# Altium footprint library 7-Connectors-11.PcbLib: 59 footprints (part 3 of 4)
Each footprint in its own frame and in the unit in brackets; x right, y up, seen from the top. Pads: shape width x height; smd on the part's side, far side on the other; paste and mask are expansions set on the pad; w line width, h text height; cw(c..) or ccw(c..) is an arc to the next point about the centre after c.
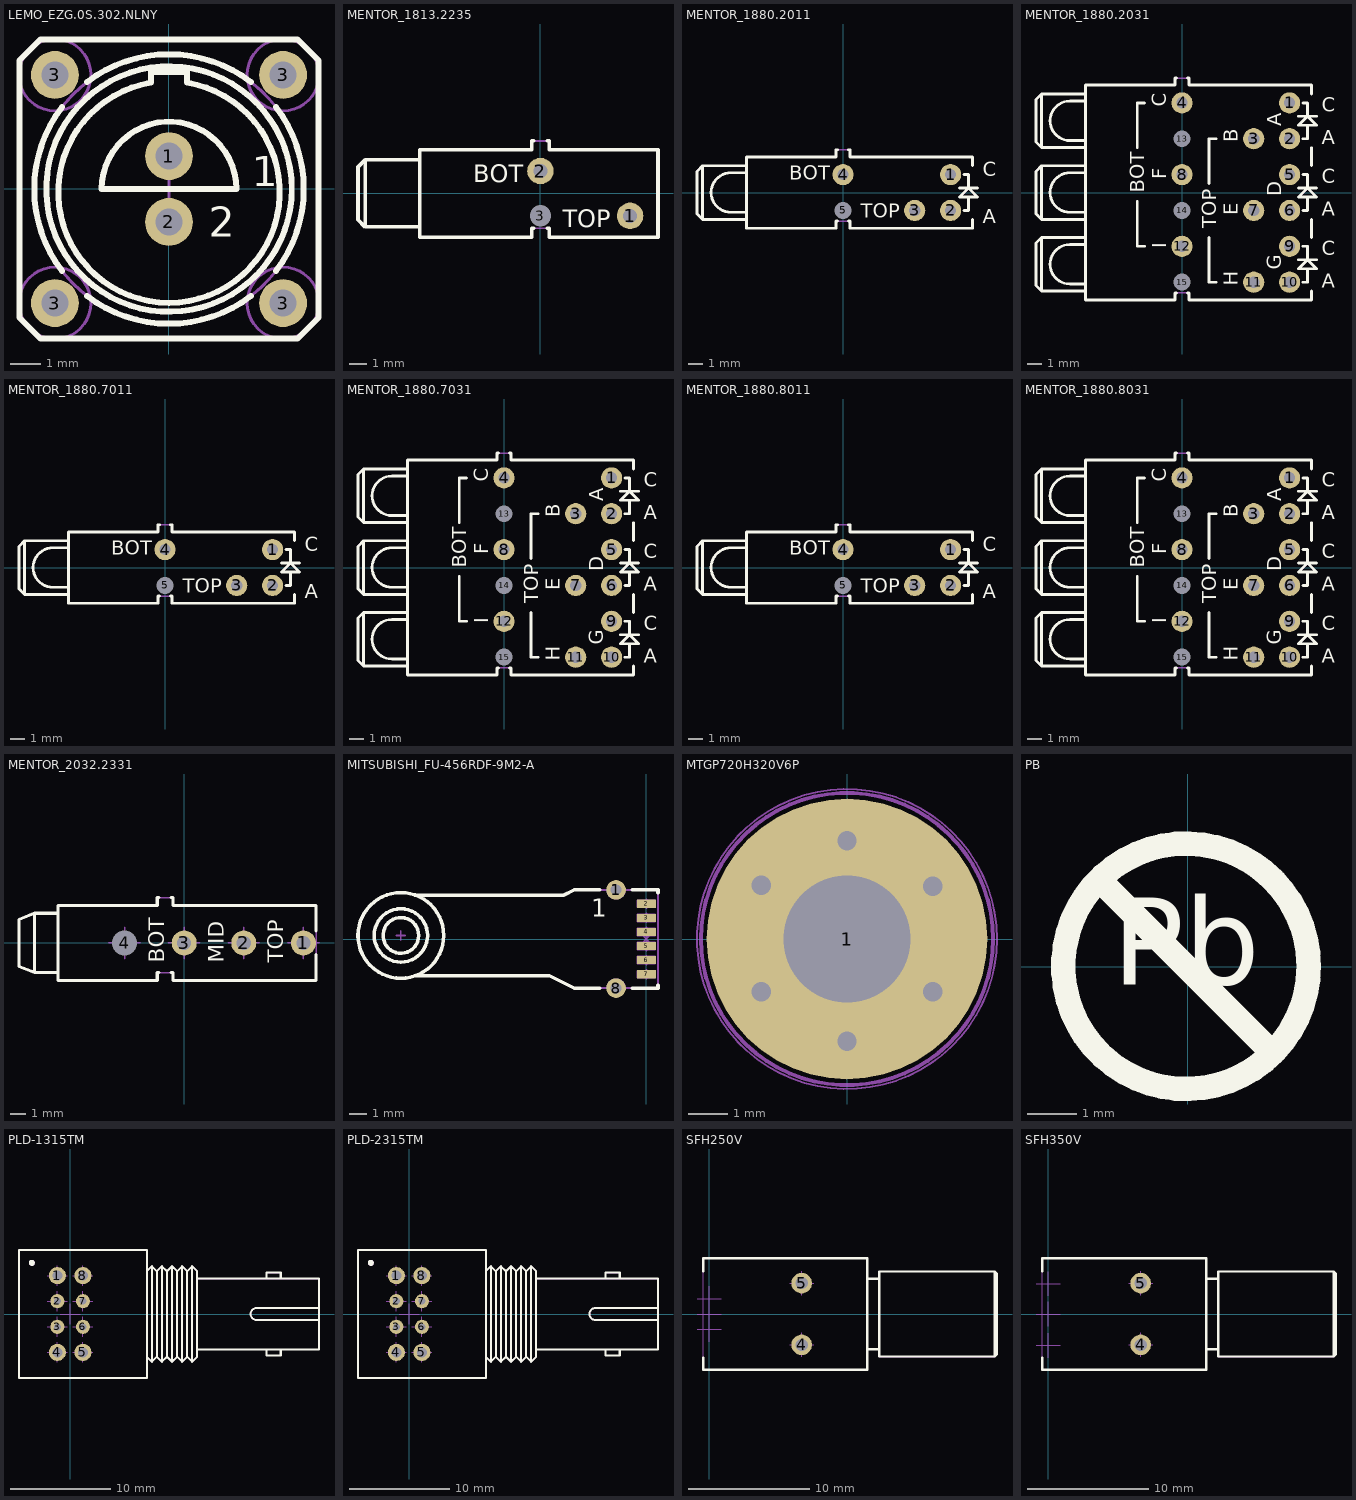
[diagram p2: the footprints below, top view; thin cyan lines are the x and y axes]

## LEMO_EZG.0S.302.NLNY [mm] "Serie 0S, 1 Female + 1 Male Contacts, Straight Socket With Key (G)"
height 15.8
pads (6):
  round 1.6 hole 0.9: 1(0,1.1) 2(0,-1.1) 3(-3.81,-3.81) 3(-3.81,3.81) 3(3.81,-3.81) 3(3.81,3.81)
Top Overlay:
  circle w0.2: c0,0 r4.1
  lines w0.2: -3.573,-2.736 cw(c0,0) -3.573,2.736 ; -2.736,-3.573 ccw(c0,0) 2.736,-3.573 ; -2.736,3.573 cw(c0,0) 2.736,3.573 ; 3.573,-2.736 ccw(c0,0) 3.573,2.736 ; -5,-4.293 -4.293,-5 4.293,-5 5,-4.293 5,4.293 4.293,5 -4.293,5 -5,4.293 -5,-4.293 ; -2.25,0 cw(c0,0) 2.25,0 -2.25,0 ; -0.6,3.551 ccw(c0,-0.1) 0.6,3.551 0.6,3.9 -0.6,3.9 -0.6,3.551
  text "1" at 2.764,0.091 h1
  text "2" at 1.326,-1.598 h1
Mechanical 8:
  circle w0.1: c-3.81,3.81 r1.2
  circle w0.1: c3.81,3.81 r1.2
  circle w0.1: c3.81,-3.81 r1.2
  circle w0.1: c-3.81,-3.81 r1.2
  lines w0.1: -4.31,-3.81 -3.81,-3.81 ; -4.31,3.81 -3.81,3.81 ; -3.81,-4.31 -3.81,-3.81 ; -3.81,-3.31 -3.81,-3.81 ; -3.81,3.31 -3.81,3.81 ; -3.81,4.31 -3.81,3.81 ; -3.31,-3.81 -3.81,-3.81 ; -3.31,3.81 -3.81,3.81 ; -0.5,-1.1 0,-1.1 ; -0.5,0 0,0 ; -0.5,1.1 0,1.1 ; 0,-1.6 0,-1.1 ; 0,-0.6 0,-1.1 ; 0,-0.5 0,0 ; 0,0.5 0,0 ; 0,0.6 0,1.1 ; 0,1.6 0,1.1 ; 0.5,-1.1 0,-1.1 ; 0.5,0 0,0 ; 0.5,1.1 0,1.1 ; 3.31,-3.81 3.81,-3.81 ; 3.31,3.81 3.81,3.81 ; 3.81,-4.31 3.81,-3.81 ; 3.81,-3.31 3.81,-3.81 ; 3.81,3.31 3.81,3.81 ; 3.81,4.31 3.81,3.81 ; 4.31,-3.81 3.81,-3.81 ; 4.31,3.81 3.81,3.81
Mechanical 14:
  circle w0.1: c0,0 r4.5
  circle w0.1: c0,0 r4.1
  circle w0.1: c0,1.1 r0.55
  circle w0.1: c0,-1.1 r0.5
  lines w0.1: -0.5,-1.1 0.5,-1.1 ; -0.49,-1.2 0.49,-1.2 ; -0.49,-1 0.49,-1 ; -0.458,-1.3 0.458,-1.3 ; -0.458,-0.9 0.458,-0.9 ; -0.4,-1.4 0.4,-1.4 ; -0.4,-0.8 0.4,-0.8 ; -0.3,-1.5 0.3,-1.5 ; -0.3,-0.7 0.3,-0.7 ; -5,-4.293 -4.293,-5 4.293,-5 5,-4.293 5,4.293 4.293,5 -4.293,5 -5,4.293 -5,-4.293 ; -2.25,0 cw(c0,0) 2.25,0 -2.25,0 ; -0.6,3.551 ccw(c0,-0.1) 0.6,3.551 0.6,3.9 -0.6,3.9 -0.6,3.551
  text "1" at 2.764,0.091 h1
  text "2" at 1.326,-1.598 h1
3D body "LEMO_EZG.0S.302.NLNY.stp": height 15.8, standoff -4, extent -5.01,-5.004 5.004,5.002

## MENTOR_1813.2235 [mm] "2 x Right Angled Test Jack 2mm"
height 9.95
pads (3):
  round 1.5 hole 0.8: 1(5.08,-1.27) 2(0,1.27)
  round 1 hole 1.2 unplated mask+0.2: 3(0,-1.27)
Top Overlay:
  lines w0.2: -6.84,-1.9 -9.94,-1.9 ; -6.84,1.9 -9.94,1.9 ; -0.39,-1.975 -0.5,-1.975 -0.5,-2.475 -6.84,-2.475 -6.84,2.475 -0.5,2.475 -0.5,2.975 -0.39,2.975 ; 0.39,-1.975 0.5,-1.975 0.5,-2.475 6.66,-2.475 6.66,2.475 0.5,2.475 0.5,2.975 0.39,2.975 ; -9.94,-1.9 -9.94,1.9 ; -9.94,-1.9 -10.34,-1.5 -10.34,1.5 -9.94,1.9
  text "BOT" at -3.81,0.635 h1
  text "TOP" at 1.27,-1.905 h1
Mechanical 14:
  lines w0.1: -6.84,-1.9 -9.94,-1.9 ; -6.84,1.9 -9.94,1.9 ; -9.94,-1.9 -9.94,1.9 ; -9.94,-1.9 -10.34,-1.5 -10.34,1.5 -9.94,1.9 ; -0.5,2.975 0.5,2.975 ; -0.5,2.975 -0.5,2.475 -6.84,2.475 -6.84,-2.475 -0.5,-2.475 -0.5,-1.975 0.5,-1.975 0.5,-2.475 6.66,-2.475 6.66,2.475 0.5,2.475 0.5,2.975 ; -0.5,2.975 0.5,2.975
3D body "MENTOR_1813.2235.stp": height 9.95, standoff -3.2, extent -10.3,-2.4 6.7,3.05

## MENTOR_1880.2011 [mm] "2 x Test Jack 2mm + 1 x Red LED 3mm PCB Edge Mounting"
height 15
pads (5):
  round 1.5 hole 0.8: 1(7.62,1.27) 2(7.62,-1.27) 3(5.08,-1.27) 4(0,1.27)
  round 1 hole 1.2 unplated mask+0.2: 5(0,-1.27)
Top Overlay:
  lines w0.2: -6.84,-1.9 -9.94,-1.9 ; -6.84,-1.4 -7.94,-1.4 cw(c-7.94,0) -7.94,1.4 -6.84,1.4 ; -6.84,1.9 -9.94,1.9 ; -0.39,-2.025 -0.5,-2.025 -0.5,-2.525 -6.84,-2.525 -6.84,2.525 -0.5,2.525 -0.5,3.025 -0.39,3.025 ; 0.39,-2.025 0.5,-2.025 0.5,-2.525 9.16,-2.525 9.16,-1.905 ; 0.39,3.025 0.5,3.025 0.5,2.525 9.16,2.525 9.16,1.905 ; 8.255,0.318 9.525,0.318 ; 8.573,-1.27 8.89,-1.27 ; 8.573,1.27 8.89,1.27 8.89,0.318 ; 8.62,-1.27 8.89,-1.27 ; 8.89,-0.318 8.89,-1.27 ; -9.94,-1.9 -10.34,-1.5 -10.34,1.5 -9.94,1.9 ; -9.94,-1.9 -9.94,1.9 ; 8.89,0.318 9.525,-0.318 8.255,-0.318 8.89,0.318
  text "BOT" at -3.81,0.889 h1
  text "TOP" at 1.27,-1.778 h1
  text "A" at 9.906,-2.159 h1
  text "C" at 9.906,1.143 h1
Mechanical 14:
  lines w0.1: -6.84,-1.9 -9.94,-1.9 ; -6.84,1.9 -9.94,1.9 ; 8.255,0.318 9.525,0.318 ; 8.573,-1.27 8.89,-1.27 ; 8.573,1.27 8.89,1.27 8.89,0.318 ; 8.62,-1.27 8.89,-1.27 ; 8.89,-0.318 8.89,-1.27 ; 9.16,-1.905 9.16,-2.525 0.5,-2.525 0.5,-2.025 -0.5,-2.025 -0.5,-2.525 -6.84,-2.525 -6.84,2.525 -0.5,2.525 -0.5,3.025 0.5,3.025 0.5,2.525 9.16,2.525 9.16,1.905 ; -9.94,-1.9 -10.34,-1.5 -10.34,1.5 -9.94,1.9 ; -9.94,-1.9 -9.94,1.9 ; -7.94,-1.4 cw(c-7.94,0) -7.94,1.4 ; -7.94,-1.4 -6.84,-1.4 -7.94,-1.4 ; -7.94,1.4 -6.84,1.4 -7.94,1.4 ; 8.89,0.318 9.525,-0.318 8.255,-0.318 8.89,0.318
  text "A" at 9.906,-2.159 h1
  text "TOP" at 1.27,-1.778 h1
  text "BOT" at -3.81,0.889 h1
  text "C" at 9.906,1.143 h1
3D body "MENTOR_1880.2011.stp": height 15, standoff -3.2, extent -10.3,-2.575 9.2,2.975

## MENTOR_1880.2031 [mm] "6 x Test Jack 2mm + 3 x Red LED 3mm PCB Edge Mounting"
height 15
pads (15):
  round 1.5 hole 0.8: 1(7.62,6.35) 2(7.62,3.81) 3(5.08,3.81) 4(0,6.35) 5(7.62,1.27) 6(7.62,-1.27) 7(5.08,-1.27) 8(0,1.27) 9(7.62,-3.81) 10(7.62,-6.35) 11(5.08,-6.35) 12(0,-3.81)
  round 1 hole 1.2 unplated mask+0.2: 13(0,3.81) 14(0,-1.27) 15(0,-6.35)
Top Overlay:
  lines w0.2: -6.84,-6.98 -9.94,-6.98 ; -6.84,-6.48 -7.94,-6.48 cw(c-7.94,-5.08) -7.94,-3.68 -6.84,-3.68 ; -6.84,-3.18 -9.94,-3.18 ; -6.84,-1.9 -9.94,-1.9 ; -6.84,-1.4 -7.94,-1.4 cw(c-7.94,0) -7.94,1.4 -6.84,1.4 ; -6.84,1.9 -9.94,1.9 ; -6.84,3.18 -9.94,3.18 ; -6.84,3.68 -7.94,3.68 cw(c-7.94,5.08) -7.94,6.48 -6.84,6.48 ; -6.84,6.98 -9.94,6.98 ; -3.175,-0.635 -3.175,-3.81 -2.667,-3.81 ; -3.175,3.175 -3.175,6.35 -2.667,6.35 ; -0.39,-7.105 -0.5,-7.105 -0.5,-7.605 -6.84,-7.605 -6.84,7.605 -0.5,7.605 -0.5,8.105 -0.39,8.105 ; 0.39,-7.105 0.5,-7.105 0.5,-7.605 9.16,-7.605 9.16,-6.985 ; 0.39,8.105 0.5,8.105 0.5,7.605 9.16,7.605 9.16,6.985 ; 1.905,-3.175 1.905,-6.35 2.413,-6.35 ; 1.905,0.635 1.905,3.81 2.413,3.81 ; 8.255,-4.762 9.525,-4.762 ; 8.255,0.318 9.525,0.318 ; 8.255,5.398 9.525,5.398 ; 8.573,-6.35 8.89,-6.35 ; 8.573,-3.81 8.89,-3.81 8.89,-4.762 ; 8.573,-1.27 8.89,-1.27 ; 8.573,1.27 8.89,1.27 8.89,0.318 ; 8.573,3.81 8.89,3.81 ; 8.573,6.35 8.89,6.35 8.89,5.398 ; 8.62,-6.35 8.89,-6.35 ; 8.62,-1.27 8.89,-1.27 ; 8.62,3.81 8.89,3.81 ; 8.89,-5.398 8.89,-6.35 ; 8.89,-0.318 8.89,-1.27 ; 8.89,4.762 8.89,3.81 ; 9.16,-3.175 9.16,-1.905 ; 9.16,1.905 9.16,3.175 ; -9.94,-6.98 -10.34,-6.58 -10.34,-3.58 -9.94,-3.18 ; -9.94,-6.98 -9.94,-3.18 ; -9.94,-1.9 -9.94,1.9 ; -9.94,-1.9 -10.34,-1.5 -10.34,1.5 -9.94,1.9 ; -9.94,3.18 -10.34,3.58 -10.34,6.58 -9.94,6.98 ; -9.94,3.18 -9.94,6.98 ; 8.89,-4.762 9.525,-5.398 8.255,-5.398 8.89,-4.762 ; 8.89,0.318 8.255,-0.318 9.525,-0.318 8.89,0.318 ; 8.89,5.398 9.525,4.762 8.255,4.762 8.89,5.398
  text "BOT" at -2.667,0 h1
  text "C" at -1.116,6.091 h1
  text "I" at -1.116,-3.942 h1
  text "F" at -1.116,0.932 h1
  text "C" at 9.906,0.643 h1
  text "A" at 9.906,-1.659 h1
  text "E" at 3.964,-1.608 h1
  text "H" at 3.964,-6.609 h1
  text "A" at 9.906,-6.739 h1
  text "C" at 9.906,-4.437 h1
  text "B" at 3.964,3.551 h1
  text "A" at 9.906,3.421 h1
  text "C" at 9.906,5.723 h1
  text "A" at 7.012,4.695 h1
  text "D" at 7.012,-0.258 h1
  text "G" at 7.012,-5.465 h1
  text "TOP" at 2.413,-2.54 h1
Mechanical 14:
  lines w0.1: -6.84,-6.98 -9.94,-6.98 ; -6.84,-3.18 -9.94,-3.18 ; -6.84,-1.9 -9.94,-1.9 ; -6.84,1.9 -9.94,1.9 ; -6.84,3.18 -9.94,3.18 ; -6.84,6.98 -9.94,6.98 ; -3.175,-0.635 -3.175,-3.81 -2.667,-3.81 ; -3.175,3.175 -3.175,6.35 -2.667,6.35 ; 1.905,-3.175 1.905,-6.35 2.413,-6.35 ; 1.905,0.635 1.905,3.81 2.413,3.81 ; 8.255,-4.762 9.525,-4.762 ; 8.255,0.318 9.525,0.318 ; 8.255,5.398 9.525,5.398 ; 8.573,-6.35 8.89,-6.35 ; 8.573,-3.81 8.89,-3.81 8.89,-4.762 ; 8.573,-1.27 8.89,-1.27 ; 8.573,1.27 8.89,1.27 8.89,0.318 ; 8.573,3.81 8.89,3.81 ; 8.573,6.35 8.89,6.35 8.89,5.398 ; 8.62,-6.35 8.89,-6.35 ; 8.62,-1.27 8.89,-1.27 ; 8.62,3.81 8.89,3.81 ; 8.89,-5.398 8.89,-6.35 ; 8.89,-0.318 8.89,-1.27 ; 8.89,4.762 8.89,3.81 ; 9.16,-6.985 9.16,-7.605 0.5,-7.605 0.5,-7.105 -0.5,-7.105 -0.5,-7.605 -6.84,-7.605 -6.84,7.605 -0.5,7.605 -0.5,8.105 0.5,8.105 0.5,7.605 9.16,7.605 9.16,6.985 ; 9.16,-3.175 9.16,-1.905 ; 9.16,1.905 9.16,3.175 ; -9.94,-6.98 -10.34,-6.58 -10.34,-3.58 -9.94,-3.18 ; -9.94,-6.98 -9.94,-3.18 ; -9.94,-1.9 -9.94,1.9 ; -9.94,-1.9 -10.34,-1.5 -10.34,1.5 -9.94,1.9 ; -9.94,3.18 -10.34,3.58 -10.34,6.58 -9.94,6.98 ; -9.94,3.18 -9.94,6.98 ; -7.94,-6.48 cw(c-7.94,-5.08) -7.94,-3.68 ; -7.94,-6.48 -6.84,-6.48 -7.94,-6.48 ; -7.94,-3.68 -6.84,-3.68 -7.94,-3.68 ; -7.94,-1.4 cw(c-7.94,0) -7.94,1.4 ; -7.94,-1.4 -6.84,-1.4 -7.94,-1.4 ; -7.94,1.4 -6.84,1.4 -7.94,1.4 ; -7.94,3.68 cw(c-7.94,5.08) -7.94,6.48 ; -7.94,3.68 -6.84,3.68 -7.94,3.68 ; -7.94,6.48 -6.84,6.48 -7.94,6.48 ; 8.89,-4.762 9.525,-5.398 8.255,-5.398 8.89,-4.762 ; 8.89,0.318 8.255,-0.318 9.525,-0.318 8.89,0.318 ; 8.89,5.398 9.525,4.762 8.255,4.762 8.89,5.398
  text "BOT" at -2.667,0 h1
  text "C" at -1.116,6.091 h1
  text "I" at -1.116,-3.942 h1
  text "F" at -1.116,0.932 h1
  text "E" at 3.964,-1.608 h1
  text "A" at 9.906,-1.659 h1
  text "C" at 9.906,0.643 h1
  text "C" at 9.906,-4.437 h1
  text "A" at 9.906,-6.739 h1
  text "H" at 3.964,-6.609 h1
  text "C" at 9.906,5.723 h1
  text "A" at 9.906,3.421 h1
  text "B" at 3.964,3.551 h1
  text "A" at 7.012,4.695 h1
  text "D" at 7.012,-0.258 h1
  text "G" at 7.012,-5.465 h1
  text "TOP" at 2.413,-2.54 h1
3D body "MENTOR_1880.2031.stp": height 15, standoff -3.1, extent -10.34,-7.6 9.16,8.1

## MENTOR_1880.7011 [mm] "2 x Test Jack 2mm + 1 x Yellow LED 3mm PCB Edge Mounting"
height 15
pads (5):
  round 1.5 hole 0.8: 1(7.62,1.27) 2(7.62,-1.27) 3(5.08,-1.27) 4(0,1.27)
  round 1 hole 1.2 unplated mask+0.2: 5(0,-1.27)
Top Overlay:
  lines w0.2: -6.84,-1.9 -9.94,-1.9 ; -6.84,-1.4 -7.94,-1.4 cw(c-7.94,0) -7.94,1.4 -6.84,1.4 ; -6.84,1.9 -9.94,1.9 ; -0.39,-2.025 -0.5,-2.025 -0.5,-2.525 -6.84,-2.525 -6.84,2.525 -0.5,2.525 -0.5,3.025 -0.39,3.025 ; 0.39,-2.025 0.5,-2.025 0.5,-2.525 9.16,-2.525 9.16,-1.905 ; 0.39,3.025 0.5,3.025 0.5,2.525 9.16,2.525 9.16,1.905 ; 8.255,0.318 9.525,0.318 ; 8.573,-1.27 8.89,-1.27 ; 8.573,1.27 8.89,1.27 8.89,0.318 ; 8.62,-1.27 8.89,-1.27 ; 8.89,-0.318 8.89,-1.27 ; -9.94,-1.9 -10.34,-1.5 -10.34,1.5 -9.94,1.9 ; -9.94,-1.9 -9.94,1.9 ; 8.89,0.318 9.525,-0.318 8.255,-0.318 8.89,0.318
  text "BOT" at -3.81,0.889 h1
  text "TOP" at 1.27,-1.778 h1
  text "A" at 9.906,-2.159 h1
  text "C" at 9.906,1.143 h1
Mechanical 14:
  lines w0.1: -6.84,-1.9 -9.94,-1.9 ; -6.84,1.9 -9.94,1.9 ; 8.255,0.318 9.525,0.318 ; 8.573,-1.27 8.89,-1.27 ; 8.573,1.27 8.89,1.27 8.89,0.318 ; 8.62,-1.27 8.89,-1.27 ; 8.89,-0.318 8.89,-1.27 ; 9.16,-1.905 9.16,-2.525 0.5,-2.525 0.5,-2.025 -0.5,-2.025 -0.5,-2.525 -6.84,-2.525 -6.84,2.525 -0.5,2.525 -0.5,3.025 0.5,3.025 0.5,2.525 9.16,2.525 9.16,1.905 ; -9.94,-1.9 -10.34,-1.5 -10.34,1.5 -9.94,1.9 ; -9.94,-1.9 -9.94,1.9 ; -7.94,-1.4 cw(c-7.94,0) -7.94,1.4 ; -7.94,-1.4 -6.84,-1.4 -7.94,-1.4 ; -7.94,1.4 -6.84,1.4 -7.94,1.4 ; 8.89,0.318 9.525,-0.318 8.255,-0.318 8.89,0.318
  text "A" at 9.906,-2.159 h1
  text "TOP" at 1.27,-1.778 h1
  text "BOT" at -3.81,0.889 h1
  text "C" at 9.906,1.143 h1
3D body "MENTOR_1880.7011.stp": height 15, standoff -3.2, extent -10.3,-2.575 9.2,2.975

## MENTOR_1880.7031 [mm] "6 x Test Jack 2mm + 3 x Yellow LED 3mm PCB Edge Mounting"
height 15
pads (15):
  round 1.5 hole 0.8: 1(7.62,6.35) 2(7.62,3.81) 3(5.08,3.81) 4(0,6.35) 5(7.62,1.27) 6(7.62,-1.27) 7(5.08,-1.27) 8(0,1.27) 9(7.62,-3.81) 10(7.62,-6.35) 11(5.08,-6.35) 12(0,-3.81)
  round 1 hole 1.2 unplated mask+0.2: 13(0,3.81) 14(0,-1.27) 15(0,-6.35)
Top Overlay:
  lines w0.2: -6.84,-6.98 -9.94,-6.98 ; -6.84,-6.48 -7.94,-6.48 cw(c-7.94,-5.08) -7.94,-3.68 -6.84,-3.68 ; -6.84,-3.18 -9.94,-3.18 ; -6.84,-1.9 -9.94,-1.9 ; -6.84,-1.4 -7.94,-1.4 cw(c-7.94,0) -7.94,1.4 -6.84,1.4 ; -6.84,1.9 -9.94,1.9 ; -6.84,3.18 -9.94,3.18 ; -6.84,3.68 -7.94,3.68 cw(c-7.94,5.08) -7.94,6.48 -6.84,6.48 ; -6.84,6.98 -9.94,6.98 ; -3.175,-0.635 -3.175,-3.81 -2.667,-3.81 ; -3.175,3.175 -3.175,6.35 -2.667,6.35 ; -0.39,-7.105 -0.5,-7.105 -0.5,-7.605 -6.84,-7.605 -6.84,7.605 -0.5,7.605 -0.5,8.105 -0.39,8.105 ; 0.39,-7.105 0.5,-7.105 0.5,-7.605 9.16,-7.605 9.16,-6.985 ; 0.39,8.105 0.5,8.105 0.5,7.605 9.16,7.605 9.16,6.985 ; 1.905,-3.175 1.905,-6.35 2.413,-6.35 ; 1.905,0.635 1.905,3.81 2.413,3.81 ; 8.255,-4.762 9.525,-4.762 ; 8.255,0.318 9.525,0.318 ; 8.255,5.398 9.525,5.398 ; 8.573,-6.35 8.89,-6.35 ; 8.573,-3.81 8.89,-3.81 8.89,-4.762 ; 8.573,-1.27 8.89,-1.27 ; 8.573,1.27 8.89,1.27 8.89,0.318 ; 8.573,3.81 8.89,3.81 ; 8.573,6.35 8.89,6.35 8.89,5.398 ; 8.62,-6.35 8.89,-6.35 ; 8.62,-1.27 8.89,-1.27 ; 8.62,3.81 8.89,3.81 ; 8.89,-5.398 8.89,-6.35 ; 8.89,-0.318 8.89,-1.27 ; 8.89,4.762 8.89,3.81 ; 9.16,-3.175 9.16,-1.905 ; 9.16,1.905 9.16,3.175 ; -9.94,-6.98 -10.34,-6.58 -10.34,-3.58 -9.94,-3.18 ; -9.94,-6.98 -9.94,-3.18 ; -9.94,-1.9 -9.94,1.9 ; -9.94,-1.9 -10.34,-1.5 -10.34,1.5 -9.94,1.9 ; -9.94,3.18 -10.34,3.58 -10.34,6.58 -9.94,6.98 ; -9.94,3.18 -9.94,6.98 ; 8.89,-4.762 9.525,-5.398 8.255,-5.398 8.89,-4.762 ; 8.89,0.318 8.255,-0.318 9.525,-0.318 8.89,0.318 ; 8.89,5.398 9.525,4.762 8.255,4.762 8.89,5.398
  text "BOT" at -2.667,0 h1
  text "C" at -1.116,6.091 h1
  text "I" at -1.116,-3.942 h1
  text "F" at -1.116,0.932 h1
  text "C" at 9.906,0.643 h1
  text "A" at 9.906,-1.659 h1
  text "E" at 3.964,-1.608 h1
  text "H" at 3.964,-6.609 h1
  text "A" at 9.906,-6.739 h1
  text "C" at 9.906,-4.437 h1
  text "B" at 3.964,3.551 h1
  text "A" at 9.906,3.421 h1
  text "C" at 9.906,5.723 h1
  text "A" at 7.012,4.695 h1
  text "D" at 7.012,-0.258 h1
  text "G" at 7.012,-5.465 h1
  text "TOP" at 2.413,-2.54 h1
Mechanical 14:
  lines w0.1: -6.84,-6.98 -9.94,-6.98 ; -6.84,-3.18 -9.94,-3.18 ; -6.84,-1.9 -9.94,-1.9 ; -6.84,1.9 -9.94,1.9 ; -6.84,3.18 -9.94,3.18 ; -6.84,6.98 -9.94,6.98 ; -3.175,-0.635 -3.175,-3.81 -2.667,-3.81 ; -3.175,3.175 -3.175,6.35 -2.667,6.35 ; 1.905,-3.175 1.905,-6.35 2.413,-6.35 ; 1.905,0.635 1.905,3.81 2.413,3.81 ; 8.255,-4.762 9.525,-4.762 ; 8.255,0.318 9.525,0.318 ; 8.255,5.398 9.525,5.398 ; 8.573,-6.35 8.89,-6.35 ; 8.573,-3.81 8.89,-3.81 8.89,-4.762 ; 8.573,-1.27 8.89,-1.27 ; 8.573,1.27 8.89,1.27 8.89,0.318 ; 8.573,3.81 8.89,3.81 ; 8.573,6.35 8.89,6.35 8.89,5.398 ; 8.62,-6.35 8.89,-6.35 ; 8.62,-1.27 8.89,-1.27 ; 8.62,3.81 8.89,3.81 ; 8.89,-5.398 8.89,-6.35 ; 8.89,-0.318 8.89,-1.27 ; 8.89,4.762 8.89,3.81 ; 9.16,-6.985 9.16,-7.605 0.5,-7.605 0.5,-7.105 -0.5,-7.105 -0.5,-7.605 -6.84,-7.605 -6.84,7.605 -0.5,7.605 -0.5,8.105 0.5,8.105 0.5,7.605 9.16,7.605 9.16,6.985 ; 9.16,-3.175 9.16,-1.905 ; 9.16,1.905 9.16,3.175 ; -9.94,-6.98 -10.34,-6.58 -10.34,-3.58 -9.94,-3.18 ; -9.94,-6.98 -9.94,-3.18 ; -9.94,-1.9 -9.94,1.9 ; -9.94,-1.9 -10.34,-1.5 -10.34,1.5 -9.94,1.9 ; -9.94,3.18 -10.34,3.58 -10.34,6.58 -9.94,6.98 ; -9.94,3.18 -9.94,6.98 ; -7.94,-6.48 cw(c-7.94,-5.08) -7.94,-3.68 ; -7.94,-6.48 -6.84,-6.48 -7.94,-6.48 ; -7.94,-3.68 -6.84,-3.68 -7.94,-3.68 ; -7.94,-1.4 cw(c-7.94,0) -7.94,1.4 ; -7.94,-1.4 -6.84,-1.4 -7.94,-1.4 ; -7.94,1.4 -6.84,1.4 -7.94,1.4 ; -7.94,3.68 cw(c-7.94,5.08) -7.94,6.48 ; -7.94,3.68 -6.84,3.68 -7.94,3.68 ; -7.94,6.48 -6.84,6.48 -7.94,6.48 ; 8.89,-4.762 9.525,-5.398 8.255,-5.398 8.89,-4.762 ; 8.89,0.318 8.255,-0.318 9.525,-0.318 8.89,0.318 ; 8.89,5.398 9.525,4.762 8.255,4.762 8.89,5.398
  text "BOT" at -2.667,0 h1
  text "C" at -1.116,6.091 h1
  text "I" at -1.116,-3.942 h1
  text "F" at -1.116,0.932 h1
  text "E" at 3.964,-1.608 h1
  text "A" at 9.906,-1.659 h1
  text "C" at 9.906,0.643 h1
  text "C" at 9.906,-4.437 h1
  text "A" at 9.906,-6.739 h1
  text "H" at 3.964,-6.609 h1
  text "C" at 9.906,5.723 h1
  text "A" at 9.906,3.421 h1
  text "B" at 3.964,3.551 h1
  text "A" at 7.012,4.695 h1
  text "D" at 7.012,-0.258 h1
  text "G" at 7.012,-5.465 h1
  text "TOP" at 2.413,-2.54 h1
3D body "MENTOR_1880.7031.stp": height 15, standoff -3.1, extent -10.34,-7.6 9.16,8.1

## MENTOR_1880.8011 [mm] "2 x Test Jack 2mm + 1 x Green LED 3mm PCB Edge Mounting"
height 15
pads (5):
  round 1.5 hole 0.8: 1(7.62,1.27) 2(7.62,-1.27) 3(5.08,-1.27) 4(0,1.27)
  round 1 hole 1.2 unplated mask+0.2: 5(0,-1.27)
Top Overlay:
  lines w0.2: -6.84,-1.9 -9.94,-1.9 ; -6.84,-1.4 -7.94,-1.4 cw(c-7.94,0) -7.94,1.4 -6.84,1.4 ; -6.84,1.9 -9.94,1.9 ; -0.39,-2.025 -0.5,-2.025 -0.5,-2.525 -6.84,-2.525 -6.84,2.525 -0.5,2.525 -0.5,3.025 -0.39,3.025 ; 0.39,-2.025 0.5,-2.025 0.5,-2.525 9.16,-2.525 9.16,-1.905 ; 0.39,3.025 0.5,3.025 0.5,2.525 9.16,2.525 9.16,1.905 ; 8.255,0.318 9.525,0.318 ; 8.573,-1.27 8.89,-1.27 ; 8.573,1.27 8.89,1.27 8.89,0.318 ; 8.62,-1.27 8.89,-1.27 ; 8.89,-0.318 8.89,-1.27 ; -9.94,-1.9 -9.94,1.9 ; -9.94,-1.9 -10.34,-1.5 -10.34,1.5 -9.94,1.9 ; 8.89,0.318 8.255,-0.318 9.525,-0.318 8.89,0.318
  text "C" at 9.906,1.143 h1
  text "A" at 9.906,-2.159 h1
  text "TOP" at 1.27,-1.778 h1
  text "BOT" at -3.81,0.889 h1
Mechanical 14:
  lines w0.1: -6.84,-1.9 -9.94,-1.9 ; -6.84,1.9 -9.94,1.9 ; 8.255,0.318 9.525,0.318 ; 8.573,-1.27 8.89,-1.27 ; 8.573,1.27 8.89,1.27 8.89,0.318 ; 8.62,-1.27 8.89,-1.27 ; 8.89,-0.318 8.89,-1.27 ; 9.16,-1.905 9.16,-2.525 0.5,-2.525 0.5,-2.025 -0.5,-2.025 -0.5,-2.525 -6.84,-2.525 -6.84,2.525 -0.5,2.525 -0.5,3.025 0.5,3.025 0.5,2.525 9.16,2.525 9.16,1.905 ; -9.94,-1.9 -9.94,1.9 ; -9.94,-1.9 -10.34,-1.5 -10.34,1.5 -9.94,1.9 ; -7.94,-1.4 cw(c-7.94,0) -7.94,1.4 ; -7.94,-1.4 -6.84,-1.4 -7.94,-1.4 ; -7.94,1.4 -6.84,1.4 -7.94,1.4 ; 8.89,0.318 8.255,-0.318 9.525,-0.318 8.89,0.318
  text "C" at 9.906,1.143 h1
  text "BOT" at -3.81,0.889 h1
  text "TOP" at 1.27,-1.778 h1
  text "A" at 9.906,-2.159 h1
3D body "MENTOR_1880.8011.stp": height 15, standoff -3.2, extent -10.3,-2.575 9.2,2.975

## MENTOR_1880.8031 [mm] "6 x Test Jack 2mm + 3 x Green LED 3mm PCB Edge Mounting"
height 15
pads (15):
  round 1.5 hole 0.8: 1(7.62,6.35) 2(7.62,3.81) 3(5.08,3.81) 4(0,6.35) 5(7.62,1.27) 6(7.62,-1.27) 7(5.08,-1.27) 8(0,1.27) 9(7.62,-3.81) 10(7.62,-6.35) 11(5.08,-6.35) 12(0,-3.81)
  round 1 hole 1.2 unplated mask+0.2: 13(0,3.81) 14(0,-1.27) 15(0,-6.35)
Top Overlay:
  lines w0.2: -6.84,-6.98 -9.94,-6.98 ; -6.84,-6.48 -7.94,-6.48 cw(c-7.94,-5.08) -7.94,-3.68 -6.84,-3.68 ; -6.84,-3.18 -9.94,-3.18 ; -6.84,-1.9 -9.94,-1.9 ; -6.84,-1.4 -7.94,-1.4 cw(c-7.94,0) -7.94,1.4 -6.84,1.4 ; -6.84,1.9 -9.94,1.9 ; -6.84,3.18 -9.94,3.18 ; -6.84,3.68 -7.94,3.68 cw(c-7.94,5.08) -7.94,6.48 -6.84,6.48 ; -6.84,6.98 -9.94,6.98 ; -3.175,-0.635 -3.175,-3.81 -2.667,-3.81 ; -3.175,3.175 -3.175,6.35 -2.667,6.35 ; -0.39,-7.105 -0.5,-7.105 -0.5,-7.605 -6.84,-7.605 -6.84,7.605 -0.5,7.605 -0.5,8.105 -0.39,8.105 ; 0.39,-7.105 0.5,-7.105 0.5,-7.605 9.16,-7.605 9.16,-6.985 ; 0.39,8.105 0.5,8.105 0.5,7.605 9.16,7.605 9.16,6.985 ; 1.905,-3.175 1.905,-6.35 2.413,-6.35 ; 1.905,0.635 1.905,3.81 2.413,3.81 ; 8.255,-4.762 9.525,-4.762 ; 8.255,0.318 9.525,0.318 ; 8.255,5.398 9.525,5.398 ; 8.573,-6.35 8.89,-6.35 ; 8.573,-3.81 8.89,-3.81 8.89,-4.762 ; 8.573,-1.27 8.89,-1.27 ; 8.573,1.27 8.89,1.27 8.89,0.318 ; 8.573,3.81 8.89,3.81 ; 8.573,6.35 8.89,6.35 8.89,5.398 ; 8.62,-6.35 8.89,-6.35 ; 8.62,-1.27 8.89,-1.27 ; 8.62,3.81 8.89,3.81 ; 8.89,-5.398 8.89,-6.35 ; 8.89,-0.318 8.89,-1.27 ; 8.89,4.762 8.89,3.81 ; 9.16,-3.175 9.16,-1.905 ; 9.16,1.905 9.16,3.175 ; -9.94,-6.98 -9.94,-3.18 ; -9.94,-6.98 -10.34,-6.58 -10.34,-3.58 -9.94,-3.18 ; -9.94,-1.9 -10.34,-1.5 -10.34,1.5 -9.94,1.9 ; -9.94,-1.9 -9.94,1.9 ; -9.94,3.18 -9.94,6.98 ; -9.94,3.18 -10.34,3.58 -10.34,6.58 -9.94,6.98 ; 8.89,-4.762 8.255,-5.398 9.525,-5.398 8.89,-4.762 ; 8.89,0.318 9.525,-0.318 8.255,-0.318 8.89,0.318 ; 8.89,5.398 8.255,4.762 9.525,4.762 8.89,5.398
  text "TOP" at 2.413,-2.54 h1
  text "G" at 7.012,-5.465 h1
  text "D" at 7.012,-0.258 h1
  text "A" at 7.012,4.695 h1
  text "C" at 9.906,5.723 h1
  text "A" at 9.906,3.421 h1
  text "B" at 3.964,3.551 h1
  text "C" at 9.906,-4.437 h1
  text "A" at 9.906,-6.739 h1
  text "H" at 3.964,-6.609 h1
  text "E" at 3.964,-1.608 h1
  text "A" at 9.906,-1.659 h1
  text "C" at 9.906,0.643 h1
  text "F" at -1.116,0.932 h1
  text "I" at -1.116,-3.942 h1
  text "C" at -1.116,6.091 h1
  text "BOT" at -2.667,0 h1
Mechanical 14:
  lines w0.1: -6.84,-6.98 -9.94,-6.98 ; -6.84,-3.18 -9.94,-3.18 ; -6.84,-1.9 -9.94,-1.9 ; -6.84,1.9 -9.94,1.9 ; -6.84,3.18 -9.94,3.18 ; -6.84,6.98 -9.94,6.98 ; -3.175,-0.635 -3.175,-3.81 -2.667,-3.81 ; -3.175,3.175 -3.175,6.35 -2.667,6.35 ; 1.905,-3.175 1.905,-6.35 2.413,-6.35 ; 1.905,0.635 1.905,3.81 2.413,3.81 ; 8.255,-4.762 9.525,-4.762 ; 8.255,0.318 9.525,0.318 ; 8.255,5.398 9.525,5.398 ; 8.573,-6.35 8.89,-6.35 ; 8.573,-3.81 8.89,-3.81 8.89,-4.762 ; 8.573,-1.27 8.89,-1.27 ; 8.573,1.27 8.89,1.27 8.89,0.318 ; 8.573,3.81 8.89,3.81 ; 8.573,6.35 8.89,6.35 8.89,5.398 ; 8.62,-6.35 8.89,-6.35 ; 8.62,-1.27 8.89,-1.27 ; 8.62,3.81 8.89,3.81 ; 8.89,-5.398 8.89,-6.35 ; 8.89,-0.318 8.89,-1.27 ; 8.89,4.762 8.89,3.81 ; 9.16,-6.985 9.16,-7.605 0.5,-7.605 0.5,-7.105 -0.5,-7.105 -0.5,-7.605 -6.84,-7.605 -6.84,7.605 -0.5,7.605 -0.5,8.105 0.5,8.105 0.5,7.605 9.16,7.605 9.16,6.985 ; 9.16,-3.175 9.16,-1.905 ; 9.16,1.905 9.16,3.175 ; -9.94,-6.98 -9.94,-3.18 ; -9.94,-6.98 -10.34,-6.58 -10.34,-3.58 -9.94,-3.18 ; -9.94,-1.9 -10.34,-1.5 -10.34,1.5 -9.94,1.9 ; -9.94,-1.9 -9.94,1.9 ; -9.94,3.18 -9.94,6.98 ; -9.94,3.18 -10.34,3.58 -10.34,6.58 -9.94,6.98 ; -7.94,-6.48 cw(c-7.94,-5.08) -7.94,-3.68 ; -7.94,-6.48 -6.84,-6.48 -7.94,-6.48 ; -7.94,-3.68 -6.84,-3.68 -7.94,-3.68 ; -7.94,-1.4 cw(c-7.94,0) -7.94,1.4 ; -7.94,-1.4 -6.84,-1.4 -7.94,-1.4 ; -7.94,1.4 -6.84,1.4 -7.94,1.4 ; -7.94,3.68 cw(c-7.94,5.08) -7.94,6.48 ; -7.94,3.68 -6.84,3.68 -7.94,3.68 ; -7.94,6.48 -6.84,6.48 -7.94,6.48 ; 8.89,-4.762 8.255,-5.398 9.525,-5.398 8.89,-4.762 ; 8.89,0.318 9.525,-0.318 8.255,-0.318 8.89,0.318 ; 8.89,5.398 8.255,4.762 9.525,4.762 8.89,5.398
  text "TOP" at 2.413,-2.54 h1
  text "G" at 7.012,-5.465 h1
  text "D" at 7.012,-0.258 h1
  text "A" at 7.012,4.695 h1
  text "B" at 3.964,3.551 h1
  text "A" at 9.906,3.421 h1
  text "C" at 9.906,5.723 h1
  text "H" at 3.964,-6.609 h1
  text "A" at 9.906,-6.739 h1
  text "C" at 9.906,-4.437 h1
  text "C" at 9.906,0.643 h1
  text "A" at 9.906,-1.659 h1
  text "E" at 3.964,-1.608 h1
  text "F" at -1.116,0.932 h1
  text "I" at -1.116,-3.942 h1
  text "C" at -1.116,6.091 h1
  text "BOT" at -2.667,0 h1
3D body "MENTOR_1880.8031.stp": height 15, standoff -3.1, extent -10.34,-7.6 9.16,8.1

## MENTOR_2032.2331 [mm] "3 x Right Angled Test Jack 2mm"
height 15.1
pads (4):
  round 1.6 hole 0.9: 1(7.62,0) 2(3.81,0) 3(0,0)
  round 1.4 hole 1.6 unplated mask+0.2: 4(-3.81,0)
Top Overlay:
  lines w0.2: -8.06,-1.9 -9.56,-1.9 ; -8.06,1.9 -9.56,1.9 ; -1.61,-1.9 -1.72,-1.9 -1.72,-2.4 -8.06,-2.4 -8.06,2.4 -1.72,2.4 -1.72,2.9 -1.61,2.9 ; -0.83,-1.9 -0.72,-1.9 -0.72,-2.4 8.44,-2.4 8.44,-0.75 ; -0.83,2.9 -0.72,2.9 -0.72,2.4 8.44,2.4 8.44,0.75 ; -9.56,-1.9 -9.56,1.9 ; -9.56,-1.9 -10.56,-1.5 -10.56,1.5 -9.56,1.9
  text "MID" at 2.54,-1.27 h1
  text "TOP" at 6.35,-1.27 h1
  text "BOT" at -1.27,-1.27 h1
Mechanical 8:
  lines w0.1: -4.81,0 -3.81,0 ; -3.81,-1 -3.81,0 ; -3.81,1 -3.81,0 ; -2.81,0 -3.81,0 ; -1,0 0,0 ; 0,-1 0,0 ; 0,1 0,0 ; 1,0 0,0 ; 2.81,0 3.81,0 ; 3.81,-1 3.81,0 ; 3.81,1 3.81,0 ; 4.81,0 3.81,0 ; 6.62,0 7.62,0 ; 7.62,-1 7.62,0 ; 7.62,1 7.62,0 ; 8.62,0 7.62,0
Mechanical 14:
  lines w0.1: -8.06,-1.9 -9.56,-1.9 ; -8.06,1.9 -9.56,1.9 ; -9.56,-1.9 -9.56,1.9 ; -9.56,-1.9 -10.56,-1.5 -10.56,1.5 -9.56,1.9 ; -8.06,-2.4 -8.06,2.4 -1.72,2.4 -1.72,2.9 -0.72,2.9 -0.72,2.4 8.44,2.4 8.44,-2.4 -0.72,-2.4 -0.72,-1.9 -1.72,-1.9 -1.72,-2.4 -8.06,-2.4
  text "MID" at 2.54,-1.27 h1
  text "BOT" at 6.35,-1.27 h1
  text "TOP" at -1.27,-1.27 h1
3D body "MENTOR_2032.2331.stp": height 15.1, standoff -3.2, extent -10.56,-2.4 8.44,2.9

## MITSUBISHI_FU-456RDF-9M2-A [mm] "1.3um Band Transmitter Optical Sub Assembly  (TOSA) Laser Module"
height 14.53
pads (8):
  round 1.1 hole 0.6: 1(-1.7,2.75) 8(-1.7,-2.75)
  rect 1.05x0.45 smd: 2(0,1.975) 3(0,1.185) 4(0,0.395) 5(0,-0.395) 6(0,-1.185) 7(0,-1.975)
Top Overlay:
  circle w0.2: c-13.75,0.2 r2.4
  circle w0.2: c-13.75,0.2 r1
  circle w0.2: c-13.75,0.2 r1.495
  lines w0.2: -12.915,-2.05 -5.45,-2.05 -4.05,-2.75 -2.6,-2.75 ; -12.915,2.45 -4.65,2.45 -4.05,2.75 -2.6,2.75 ; -0.8,-2.75 0.65,-2.75 0.65,-2.605 ; -0.8,2.75 0.65,2.75 0.65,2.605
  text "1" at -3.088,1.25 h1
Mechanical 8:
  lines w0.1: -14,0.2 -13.75,0.2 ; -13.75,-0.05 -13.75,0.2 ; -13.75,0.45 -13.75,0.2 ; -13.5,0.2 -13.75,0.2 ; -1.95,-2.75 -1.7,-2.75 ; -1.95,2.75 -1.7,2.75 ; -1.7,-3 -1.7,-2.75 ; -1.7,-2.5 -1.7,-2.75 ; -1.7,2.5 -1.7,2.75 ; -1.7,3 -1.7,2.75 ; -1.45,-2.75 -1.7,-2.75 ; -1.45,2.75 -1.7,2.75 ; -0.354,-0.354 0,0 ; -0.354,0.354 0,0 ; -0.25,-1.975 0,-1.975 ; -0.25,-1.185 0,-1.185 ; -0.25,-0.395 0,-0.395 ; -0.25,0.395 0,0.395 ; -0.25,1.185 0,1.185 ; -0.25,1.975 0,1.975 ; 0,-2.225 0,-1.975 ; 0,-1.725 0,-1.975 ; 0,-1.435 0,-1.185 ; 0,-0.935 0,-1.185 ; 0,-0.645 0,-0.395 ; 0,-0.145 0,-0.395 ; 0,0.145 0,0.395 ; 0,0.645 0,0.395 ; 0,0.935 0,1.185 ; 0,1.435 0,1.185 ; 0,1.725 0,1.975 ; 0,2.225 0,1.975 ; 0.25,-1.975 0,-1.975 ; 0.25,-1.185 0,-1.185 ; 0.25,-0.395 0,-0.395 ; 0.25,0.395 0,0.395 ; 0.25,1.185 0,1.185 ; 0.25,1.975 0,1.975 ; 0.354,-0.354 0,0 ; 0.354,0.354 0,0
Mechanical 14:
  circle w0.1: c-13.75,0.2 r2.4
  circle w0.1: c-13.75,0.2 r1
  circle w0.1: c-13.75,0.2 r1.495
  lines w0.1: -12.915,-2.05 -5.45,-2.05 -4.05,-2.75 -2,-2.75 cw(c-1.7,-2.75) -1.4,-2.75 0.65,-2.75 0.65,2.75 -1.4,2.75 cw(c-1.7,2.75) -2,2.75 -4.05,2.75 -4.65,2.45 -12.915,2.45 ; -2.2,-2.75 cw(c-1.7,-2.75) -1.2,-2.75 ; -2.2,2.75 ccw(c-1.7,2.75) -1.2,2.75 ; -0.5,-2.175 0.5,-2.175 0.5,-1.775 -0.5,-1.775 -0.5,-2.175 ; -0.5,-1.385 0.5,-1.385 0.5,-0.985 -0.5,-0.985 -0.5,-1.385 ; -0.5,-0.595 0.5,-0.595 0.5,-0.195 -0.5,-0.195 -0.5,-0.595 ; -0.5,0.195 0.5,0.195 0.5,0.595 -0.5,0.595 -0.5,0.195 ; -0.5,0.985 0.5,0.985 0.5,1.385 -0.5,1.385 -0.5,0.985 ; -0.5,1.775 0.5,1.775 0.5,2.175 -0.5,2.175 -0.5,1.775
  text "1" at -3.088,1.25 h1
3D body "MITSUBISHI_FU-456RDF-9M2-A.stp": height 13.97, standoff -1.07, extent -16.15,-2.75 0.65,2.75

## MTGP720H320V6P [mm]
pads (1):
  round 7.2 hole 3.25: 1(0,0)
via -2.2,-1.35 diameter 1 hole 0.5
via -2.2,1.375 diameter 1 hole 0.5
via 0,2.525 diameter 1 hole 0.5
via 2.2,1.35 diameter 1 hole 0.5
via 0,-2.625 diameter 1 hole 0.5
via 2.2,-1.35 diameter 1 hole 0.5
Mechanical 8:
  circle w0.1: c0,0 r2.6
  circle w0.1: c0,0 r3.75
  lines w0.1: -2.657,1.625 -2.224,1.375 ; -2.632,-1.6 -2.199,-1.35 ; -2.474,0.942 -2.224,1.375 ; -2.449,-0.917 -2.199,-1.35 ; -1.974,1.808 -2.224,1.375 ; -1.949,-1.783 -2.199,-1.35 ; -1.791,1.125 -2.224,1.375 ; -1.766,-1.1 -2.199,-1.35 ; -0.5,-2.625 0,-2.625 ; -0.5,0 0,0 ; -0.5,2.525 0,2.525 ; 0,-3.125 0,-2.625 ; 0,-2.125 0,-2.625 ; 0,-0.5 0,0 ; 0,0.5 0,0 ; 0,2.025 0,2.525 ; 0,3.025 0,2.525 ; 0.5,-2.625 0,-2.625 ; 0.5,0 0,0 ; 0.5,2.525 0,2.525 ; 1.766,-1.1 2.199,-1.35 ; 1.766,1.1 2.199,1.35 ; 1.949,-1.783 2.199,-1.35 ; 1.949,1.783 2.199,1.35 ; 2.449,-0.917 2.199,-1.35 ; 2.449,0.917 2.199,1.35 ; 2.632,-1.6 2.199,-1.35 ; 2.632,1.6 2.199,1.35
Mechanical 14:
  circle w0.1: c0,0 r3.75
Mechanical 15:
  circle w0.05: c0,0 r3.85
3D body "mtgp720h320v6p.stp": height 0.1, standoff -1.75, extent -3.627,-3.627 3.628,3.628

## PB [mm]
Top Overlay:
  circle w0.5: c-0.031,0.013 r2.5
  lines w0.5: -1.737,1.719 1.675,-1.693
  text "Pb" at -1.536,-0.948 h3.05
3D body "pb.stp": height 0.02, standoff 0, extent -2.725,-2.725 2.725,2.725

## PLD-1315TM [mm] "Fiber Optic Transmitter, Through Hole Mount"
height 10.2
pads (8):
  round 1.7 hole 1: 1(-1.27,3.81) 4(-1.27,-3.81) 5(1.27,-3.81) 8(1.27,3.81)
  round 1.4 hole 0.7: 2(-1.27,1.27) 3(-1.27,-1.27) 6(1.27,-1.27) 7(1.27,1.27)
Top Overlay:
  circle w0.3: c-3.81,5.08 r0.15
  lines w0.2: 7.62,-4.25 8.12,-4.75 ; 7.62,4.25 8.12,4.75 ; 12.62,-3.525 24.72,-3.525 ; 12.62,3.525 24.72,3.525 ; 19.52,-3.525 19.52,-4.1 20.92,-4.1 20.92,-3.525 ; 19.52,3.525 19.52,4.1 20.92,4.1 20.92,3.525 ; 24.72,-0.6 18.52,-0.6 cw(c18.52,0) 18.52,0.6 24.72,0.6 ; 8.12,-4.75 8.12,4.75 ; 8.12,-4.75 8.62,-4.25 ; 8.12,4.75 8.62,4.25 ; 8.62,-4.25 8.62,4.25 ; 8.62,-4.25 9.12,-4.75 ; 8.62,4.25 9.12,4.75 ; 9.12,-4.75 9.12,4.75 ; 9.12,-4.75 9.62,-4.25 ; 9.12,4.75 9.62,4.25 ; 9.62,-4.25 9.62,4.25 ; 9.62,-4.25 10.12,-4.75 ; 9.62,4.25 10.12,4.75 ; 10.12,-4.75 10.12,4.75 ; 10.12,-4.75 10.62,-4.25 ; 10.12,4.75 10.62,4.25 ; 10.62,-4.25 10.62,4.25 ; 10.62,-4.25 11.12,-4.75 ; 10.62,4.25 11.12,4.75 ; 11.12,-4.75 11.12,4.75 ; 11.12,-4.75 11.62,-4.25 ; 11.12,4.75 11.62,4.25 ; 11.62,-4.25 11.62,4.25 ; 11.62,-4.25 12.12,-4.75 ; 11.62,4.25 12.12,4.75 ; 12.12,-4.75 12.12,4.75 ; 12.12,-4.75 12.62,-4.25 12.62,4.25 12.12,4.75 ; 24.72,-3.525 24.72,3.525 ; 24.72,-3.525 24.72,3.525 ; -5.08,-6.35 7.62,-6.35 7.62,6.35 -5.08,6.35 -5.08,-6.35
Mechanical 8:
  lines w0.1: -2.27,-3.81 -1.27,-3.81 ; -2.27,-1.27 -1.27,-1.27 ; -2.27,1.27 -1.27,1.27 ; -2.27,3.81 -1.27,3.81 ; -1.27,-4.81 -1.27,-3.81 ; -1.27,-2.81 -1.27,-3.81 ; -1.27,-2.27 -1.27,-1.27 ; -1.27,-0.27 -1.27,-1.27 ; -1.27,0.27 -1.27,1.27 ; -1.27,2.27 -1.27,1.27 ; -1.27,2.81 -1.27,3.81 ; -1.27,4.81 -1.27,3.81 ; -1,0 0,0 ; -0.27,-3.81 -1.27,-3.81 ; -0.27,-1.27 -1.27,-1.27 ; -0.27,1.27 -1.27,1.27 ; -0.27,3.81 -1.27,3.81 ; 0,-1 0,0 ; 0,1 0,0 ; 0.27,-3.81 1.27,-3.81 ; 0.27,-1.27 1.27,-1.27 ; 0.27,1.27 1.27,1.27 ; 0.27,3.81 1.27,3.81 ; 1,0 0,0 ; 1.27,-4.81 1.27,-3.81 ; 1.27,-2.81 1.27,-3.81 ; 1.27,-2.27 1.27,-1.27 ; 1.27,-0.27 1.27,-1.27 ; 1.27,0.27 1.27,1.27 ; 1.27,2.27 1.27,1.27 ; 1.27,2.81 1.27,3.81 ; 1.27,4.81 1.27,3.81 ; 2.27,-3.81 1.27,-3.81 ; 2.27,-1.27 1.27,-1.27 ; 2.27,1.27 1.27,1.27 ; 2.27,3.81 1.27,3.81
Mechanical 14:
  circle w0.3: c-3.81,5.08 r0.15
  lines w0.1: 7.62,-4.25 8.12,-4.75 ; 7.62,4.25 8.12,4.75 ; 12.62,-3.525 24.72,-3.525 24.72,3.525 12.62,3.525 ; 19.52,-3.525 19.52,-4.1 20.92,-4.1 20.92,-3.525 ; 19.52,3.525 19.52,4.1 20.92,4.1 20.92,3.525 ; 24.72,-0.6 18.52,-0.6 cw(c18.52,0) 18.52,0.6 24.72,0.6 ; 8.12,-4.75 8.12,4.75 ; 8.12,-4.75 8.62,-4.25 ; 8.12,4.75 8.62,4.25 ; 8.62,-4.25 8.62,4.25 ; 8.62,-4.25 9.12,-4.75 ; 8.62,4.25 9.12,4.75 ; 9.12,-4.75 9.12,4.75 ; 9.12,-4.75 9.62,-4.25 ; 9.12,4.75 9.62,4.25 ; 9.62,-4.25 9.62,4.25 ; 9.62,-4.25 10.12,-4.75 ; 9.62,4.25 10.12,4.75 ; 10.12,-4.75 10.12,4.75 ; 10.12,-4.75 10.62,-4.25 ; 10.12,4.75 10.62,4.25 ; 10.62,-4.25 10.62,4.25 ; 10.62,-4.25 11.12,-4.75 ; 10.62,4.25 11.12,4.75 ; 11.12,-4.75 11.12,4.75 ; 11.12,-4.75 11.62,-4.25 ; 11.12,4.75 11.62,4.25 ; 11.62,-4.25 11.62,4.25 ; 11.62,-4.25 12.12,-4.75 ; 11.62,4.25 12.12,4.75 ; 12.12,-4.75 12.12,4.75 ; 12.12,-4.75 12.62,-4.25 12.62,4.25 12.12,4.75 ; -5.08,-6.15 ccw(c-4.88,-6.15) -4.88,-6.35 7.42,-6.35 ccw(c7.42,-6.15) 7.62,-6.15 7.62,6.15 ccw(c7.42,6.15) 7.42,6.35 -4.88,6.35 ccw(c-4.88,6.15) -5.08,6.15 -5.08,-6.15
3D body "PLD-1315TM.stp": height 10.2, standoff -3.6, extent -5.08,-6.35 24.72,6.35

## PLD-2315TM [mm] "Fiber Optic Receiver, Through Hole Mount"
height 10.2
pads (8):
  round 1.7 hole 1: 1(-1.27,3.81) 4(-1.27,-3.81) 5(1.27,-3.81) 8(1.27,3.81)
  round 1.4 hole 0.7: 2(-1.27,1.27) 3(-1.27,-1.27) 6(1.27,-1.27) 7(1.27,1.27)
Top Overlay:
  circle w0.3: c-3.81,5.08 r0.15
  lines w0.2: 7.62,-4.25 8.12,-4.75 ; 7.62,4.25 8.12,4.75 ; 12.62,-3.525 24.72,-3.525 ; 12.62,3.525 24.72,3.525 ; 19.52,-3.525 19.52,-4.1 20.92,-4.1 20.92,-3.525 ; 19.52,3.525 19.52,4.1 20.92,4.1 20.92,3.525 ; 24.72,-0.6 18.52,-0.6 cw(c18.52,0) 18.52,0.6 24.72,0.6 ; 8.12,-4.75 8.62,-4.25 ; 8.12,-4.75 8.12,4.75 ; 8.12,4.75 8.62,4.25 ; 8.62,-4.25 9.12,-4.75 ; 8.62,-4.25 8.62,4.25 ; 8.62,4.25 9.12,4.75 ; 9.12,-4.75 9.62,-4.25 ; 9.12,-4.75 9.12,4.75 ; 9.12,4.75 9.62,4.25 ; 9.62,-4.25 10.12,-4.75 ; 9.62,-4.25 9.62,4.25 ; 9.62,4.25 10.12,4.75 ; 10.12,-4.75 10.62,-4.25 ; 10.12,-4.75 10.12,4.75 ; 10.12,4.75 10.62,4.25 ; 10.62,-4.25 11.12,-4.75 ; 10.62,-4.25 10.62,4.25 ; 10.62,4.25 11.12,4.75 ; 11.12,-4.75 11.62,-4.25 ; 11.12,-4.75 11.12,4.75 ; 11.12,4.75 11.62,4.25 ; 11.62,-4.25 12.12,-4.75 ; 11.62,-4.25 11.62,4.25 ; 11.62,4.25 12.12,4.75 ; 12.12,-4.75 12.62,-4.25 12.62,4.25 12.12,4.75 ; 12.12,-4.75 12.12,4.75 ; 24.72,-3.525 24.72,3.525 ; 24.72,-3.525 24.72,3.525 ; -5.08,-6.35 -5.08,6.35 7.62,6.35 7.62,-6.35 -5.08,-6.35
Mechanical 8:
  lines w0.1: -2.27,-3.81 -1.27,-3.81 ; -2.27,-1.27 -1.27,-1.27 ; -2.27,1.27 -1.27,1.27 ; -2.27,3.81 -1.27,3.81 ; -1.27,-4.81 -1.27,-3.81 ; -1.27,-2.81 -1.27,-3.81 ; -1.27,-2.27 -1.27,-1.27 ; -1.27,-0.27 -1.27,-1.27 ; -1.27,0.27 -1.27,1.27 ; -1.27,2.27 -1.27,1.27 ; -1.27,2.81 -1.27,3.81 ; -1.27,4.81 -1.27,3.81 ; -1,0 0,0 ; -0.27,-3.81 -1.27,-3.81 ; -0.27,-1.27 -1.27,-1.27 ; -0.27,1.27 -1.27,1.27 ; -0.27,3.81 -1.27,3.81 ; 0,-1 0,0 ; 0,1 0,0 ; 0.27,-3.81 1.27,-3.81 ; 0.27,-1.27 1.27,-1.27 ; 0.27,1.27 1.27,1.27 ; 0.27,3.81 1.27,3.81 ; 1,0 0,0 ; 1.27,-4.81 1.27,-3.81 ; 1.27,-2.81 1.27,-3.81 ; 1.27,-2.27 1.27,-1.27 ; 1.27,-0.27 1.27,-1.27 ; 1.27,0.27 1.27,1.27 ; 1.27,2.27 1.27,1.27 ; 1.27,2.81 1.27,3.81 ; 1.27,4.81 1.27,3.81 ; 2.27,-3.81 1.27,-3.81 ; 2.27,-1.27 1.27,-1.27 ; 2.27,1.27 1.27,1.27 ; 2.27,3.81 1.27,3.81
Mechanical 14:
  circle w0.3: c-3.81,5.08 r0.15
  lines w0.1: 7.62,-4.25 8.12,-4.75 ; 7.62,4.25 8.12,4.75 ; 12.62,-3.525 24.72,-3.525 24.72,3.525 12.62,3.525 ; 19.52,-3.525 19.52,-4.1 20.92,-4.1 20.92,-3.525 ; 19.52,3.525 19.52,4.1 20.92,4.1 20.92,3.525 ; 24.72,-0.6 18.52,-0.6 cw(c18.52,0) 18.52,0.6 24.72,0.6 ; 8.12,-4.75 8.62,-4.25 ; 8.12,-4.75 8.12,4.75 ; 8.12,4.75 8.62,4.25 ; 8.62,-4.25 9.12,-4.75 ; 8.62,-4.25 8.62,4.25 ; 8.62,4.25 9.12,4.75 ; 9.12,-4.75 9.62,-4.25 ; 9.12,-4.75 9.12,4.75 ; 9.12,4.75 9.62,4.25 ; 9.62,-4.25 10.12,-4.75 ; 9.62,-4.25 9.62,4.25 ; 9.62,4.25 10.12,4.75 ; 10.12,-4.75 10.62,-4.25 ; 10.12,-4.75 10.12,4.75 ; 10.12,4.75 10.62,4.25 ; 10.62,-4.25 11.12,-4.75 ; 10.62,-4.25 10.62,4.25 ; 10.62,4.25 11.12,4.75 ; 11.12,-4.75 11.62,-4.25 ; 11.12,-4.75 11.12,4.75 ; 11.12,4.75 11.62,4.25 ; 11.62,-4.25 12.12,-4.75 ; 11.62,-4.25 11.62,4.25 ; 11.62,4.25 12.12,4.75 ; 12.12,-4.75 12.62,-4.25 12.62,4.25 12.12,4.75 ; 12.12,-4.75 12.12,4.75 ; -5.08,-6.15 ccw(c-4.88,-6.15) -4.88,-6.35 7.42,-6.35 ccw(c7.42,-6.15) 7.62,-6.15 7.62,6.15 ccw(c7.42,6.15) 7.42,6.35 -4.88,6.35 ccw(c-4.88,6.15) -5.08,6.15 -5.08,-6.15
3D body "PLD-2315TM.stp": height 10.2, standoff -3.6, extent -5.08,-6.35 24.72,6.35

## SFH250V [mm] "Plastic Connector Housing For Plastic Fiber Optic Photodiode Detector"
height 9
pads (2):
  round 1.7 hole 1: 4(7.62,-2.54) 5(7.62,2.54)
Top Overlay:
  lines w0.2: -0.5,-3.617 -0.5,-4.6 13,-4.6 13,4.6 -0.5,4.6 -0.5,3.534 ; 13,-2.9 14,-2.9 ; 13,2.9 14,2.9 ; 23.5,-3.5 14,-3.5 14,3.5 23.5,3.5 ; 23.5,-3.5 23.5,3.5 ; 23.5,-3.5 23.7,-3.3 23.7,3.3 23.5,3.5
Mechanical 8:
  lines w0.1: -1,-1.27 0,-1.27 ; -1,0 0,0 ; -1,1.27 0,1.27 ; 0,-2.27 0,-1.27 ; 0,-1 0,0 ; 0,-0.27 0,-1.27 ; 0,0.27 0,1.27 ; 0,1 0,0 ; 0,2.27 0,1.27 ; 1,-1.27 0,-1.27 ; 1,0 0,0 ; 1,1.27 0,1.27 ; 6.62,-2.54 7.62,-2.54 ; 6.62,2.54 7.62,2.54 ; 7.62,-3.54 7.62,-2.54 ; 7.62,-1.54 7.62,-2.54 ; 7.62,1.54 7.62,2.54 ; 7.62,3.54 7.62,2.54 ; 8.62,-2.54 7.62,-2.54 ; 8.62,2.54 7.62,2.54
Mechanical 14:
  lines w0.1: 13,-2.9 14,-2.9 ; 13,2.9 14,2.9 ; 23.5,-3.5 14,-3.5 14,3.5 23.5,3.5 ; 23.5,-3.5 23.5,3.5 ; 23.5,-3.5 23.7,-3.3 23.7,3.3 23.5,3.5 ; -0.5,-4.6 13,-4.6 13,4.6 -0.5,4.6 -0.5,-4.6
3D body "SFH250V.stp": height 8.6, standoff -3.6, extent -0.5,-4.6 23.7,4.6

## SFH350V [mm] "Plastic Connector Housing For Plastic Fiber Optic Phototransistor Detector"
height 9
pads (2):
  round 1.7 hole 1: 4(7.62,-2.54) 5(7.62,2.54)
Top Overlay:
  lines w0.2: -0.5,-3.617 -0.5,-4.6 13,-4.6 13,4.6 -0.5,4.6 -0.5,3.534 ; 13,-2.9 14,-2.9 ; 13,2.9 14,2.9 ; 23.5,-3.5 23.7,-3.3 23.7,3.3 23.5,3.5 ; 23.5,-3.5 23.5,3.5 ; 23.5,-3.5 14,-3.5 14,3.5 23.5,3.5
Mechanical 8:
  lines w0.1: -1,-2.582 0,-2.582 ; -1,0 0,0 ; -1,2.498 0,2.498 ; 0,-3.582 0,-2.582 ; 0,-1.582 0,-2.582 ; 0,-1 0,0 ; 0,1 0,0 ; 0,1.498 0,2.498 ; 0,3.498 0,2.498 ; 1,-2.582 0,-2.582 ; 1,0 0,0 ; 1,2.498 0,2.498 ; 6.62,-2.54 7.62,-2.54 ; 6.62,2.54 7.62,2.54 ; 7.62,-3.54 7.62,-2.54 ; 7.62,-1.54 7.62,-2.54 ; 7.62,1.54 7.62,2.54 ; 7.62,3.54 7.62,2.54 ; 8.62,-2.54 7.62,-2.54 ; 8.62,2.54 7.62,2.54
Mechanical 14:
  lines w0.1: 13,-2.9 14,-2.9 ; 13,2.9 14,2.9 ; 23.5,-3.5 23.7,-3.3 23.7,3.3 23.5,3.5 ; 23.5,-3.5 23.5,3.5 ; 23.5,-3.5 14,-3.5 14,3.5 23.5,3.5 ; -0.5,-4.6 -0.5,4.6 13,4.6 13,-4.6 -0.5,-4.6
3D body "SFH350V.stp": height 8.6, standoff -3.6, extent -0.5,-4.6 23.7,4.6